# Altium schematic symbol library IC_Maxim.SchLib: 843 symbols (part 19 of 20) (continued)
## MAX15046BAEE+ (continued)
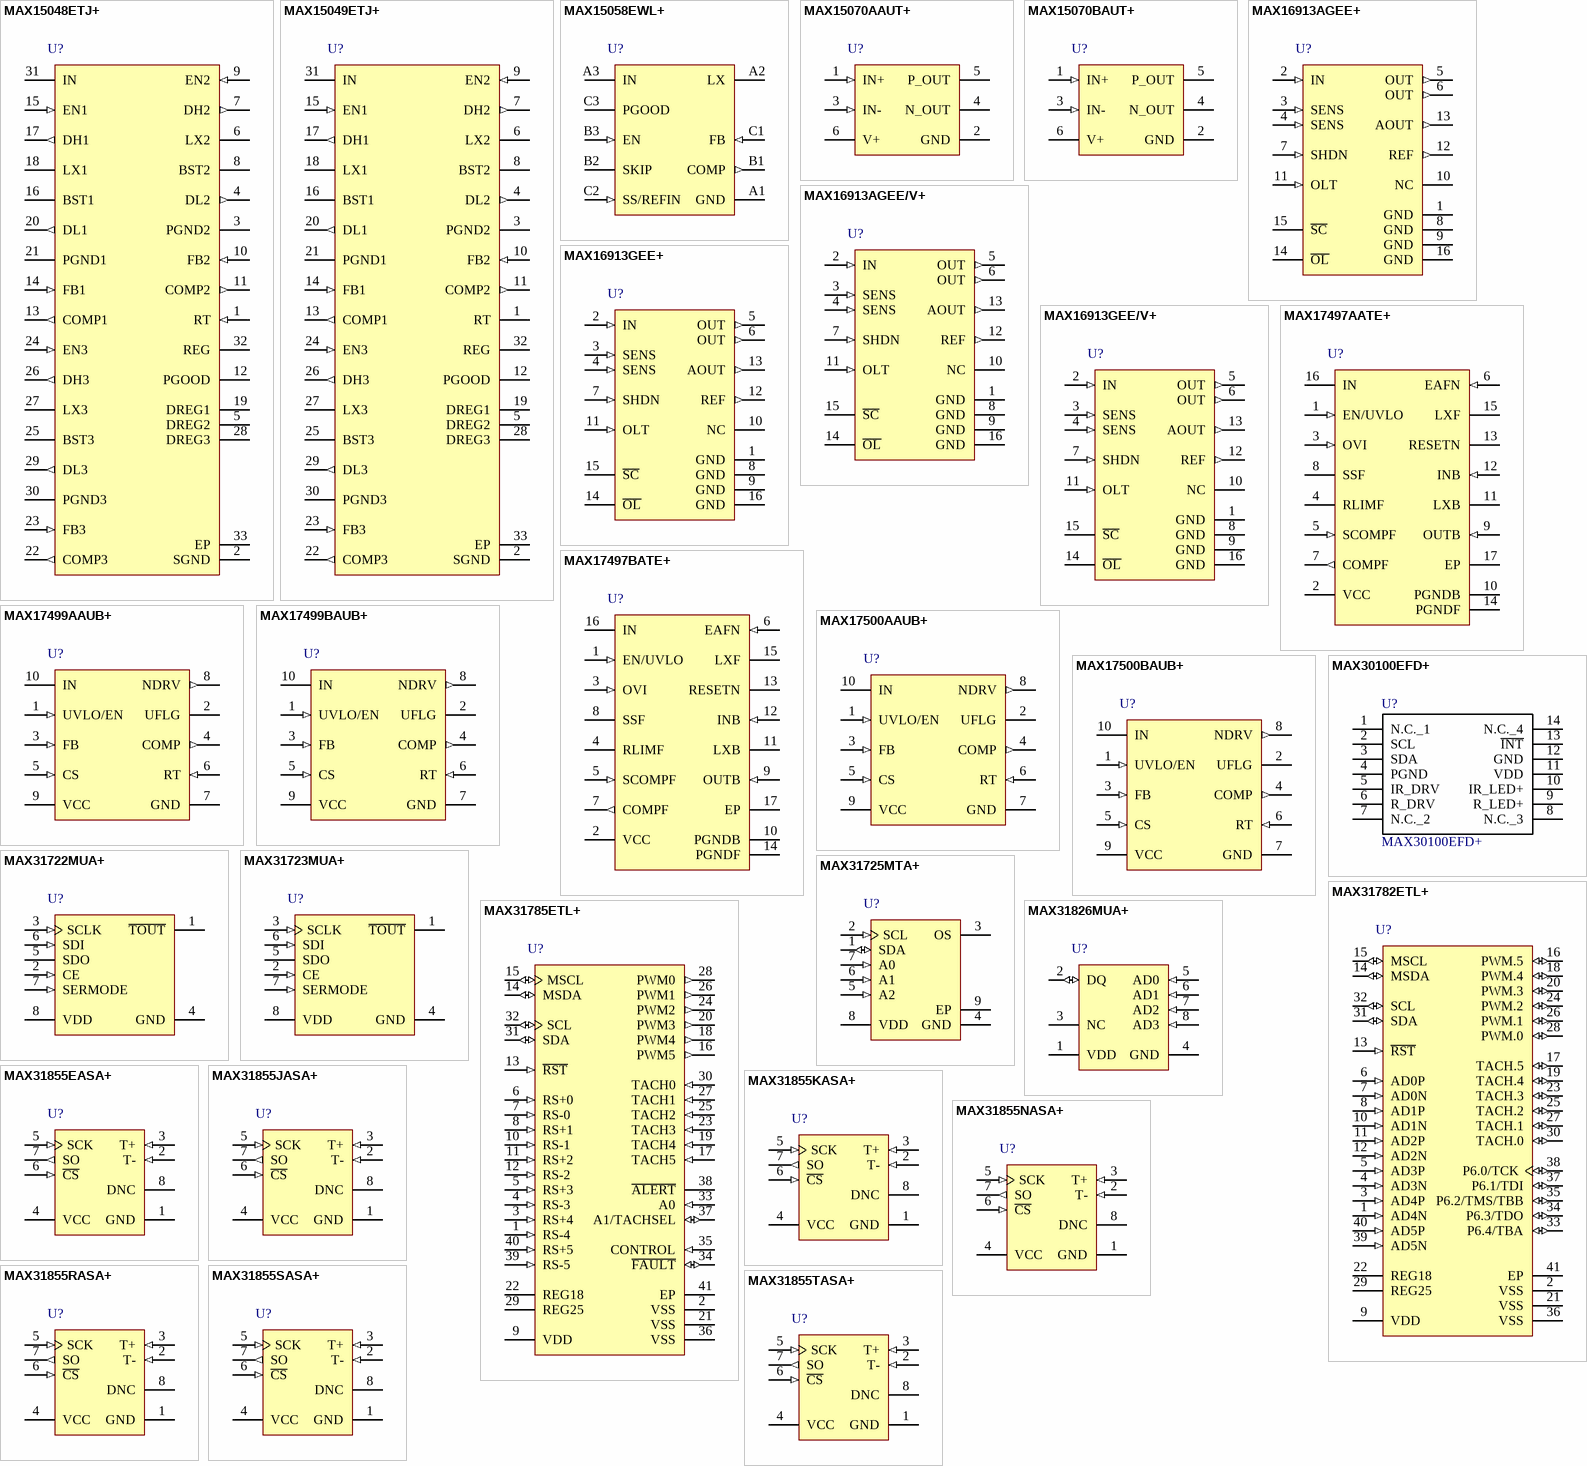
[diagram p23: symbols MAX15048ETJ+ to MAX31855TASA+]

## MAX15048ETJ+
designator U?
Triple-Output Buck Controller with Tracking/Sequencing, 32-Pin TQFN, -40癈 to +85癈, Pb-Free; DatasheetVersion: Rev 0, Jan-2010; PackageVersion: revO, 2011; PackageReference: T3255+4; PackageDescription: 32-Pin Thin Quad Flatpack, No Leads, 5 x 5 x 0.75 mm Body, 0.5 mm Pitch, TQFN, Pb-Free; Code_JEDEC: MO-220-WHHD-2; ComponentLink1Description: Manufacturer URL; ComponentLink1URL: http://www.maxim-ic.com; ComponentLink2Description: Datasheet; ComponentLink2URL: http://datasheets.maxim-ic.com/en/ds/MAX15048-MAX15049.pdf; ComponentLink3Description: Package Specification; ComponentLink3URL: http://pdfserv.maxim-ic.com/package_dwgs/21-0140.PDF
footprint QFN32_0.5-PAD(5X5) (Footprint not found)
pins: 1 RT (in), 2 SGND (power), 3 PGND2 (power), 4 DL2 (out), 5 DREG2 (power), 6 LX2, 7 DH2 (out), 8 BST2 (power), 9 EN2 (in), 10 FB2 (in), 11 COMP2 (out), 12 PGOOD (oc), 13 COMP1 (out), 14 FB1 (in), 15 EN1 (in), 16 BST1 (power), 17 DH1 (out), 18 LX1, 19 DREG1 (power), 20 DL1 (out), 21 PGND1 (power), 22 COMP3 (out), 23 FB3 (in), 24 EN3 (in), 25 BST3 (power), 26 DH3 (out), 27 LX3, 28 DREG3 (power), 29 DL3 (out), 30 PGND3 (power), 31 IN (power), 32 REG (power), 33 EP (power)

## MAX15049ETJ+
designator U?
Triple-Output Buck Controller with Tracking/Sequencing, 32-Pin TQFN, -40癈 to +85癈, Pb-Free; DatasheetVersion: Rev 0, Jan-2010; PackageVersion: revO, 2011; PackageReference: T3255+4; PackageDescription: 32-Pin Thin Quad Flatpack, No Leads, 5 x 5 x 0.75 mm Body, 0.5 mm Pitch, TQFN, Pb-Free; Code_JEDEC: MO-220-WHHD-2; ComponentLink1Description: Manufacturer URL; ComponentLink1URL: http://www.maxim-ic.com; ComponentLink2Description: Datasheet; ComponentLink2URL: http://datasheets.maxim-ic.com/en/ds/MAX15048-MAX15049.pdf; ComponentLink3Description: Package Specification; ComponentLink3URL: http://pdfserv.maxim-ic.com/package_dwgs/21-0140.PDF
footprint QFN32_0.5-PAD(5X5) (Footprint not found)
pins: 1 RT, 2 SGND (power), 3 PGND2 (power), 4 DL2 (out), 5 DREG2 (power), 6 LX2, 7 DH2 (out), 8 BST2 (power), 9 EN2 (in), 10 FB2 (in), 11 COMP2 (out), 12 PGOOD (oc), 13 COMP1 (out), 14 FB1 (in), 15 EN1 (in), 16 BST1 (power), 17 DH1 (out), 18 LX1, 19 DREG1 (power), 20 DL1 (out), 21 PGND1 (power), 22 COMP3 (out), 23 FB3 (in), 24 EN3 (in), 25 BST3 (power), 26 DH3 (out), 27 LX3, 28 DREG3 (power), 29 DL3 (out), 30 PGND3 (power), 31 IN (power), 32 REG (power), 33 EP (power)

## MAX15058EWL+
designator U?
High-Efficiency, 3A, Current-Mode Synchronous, Step-Down Switching Regulator, 9-Pin WLP, -40癈 to +85癈, Pb-Free; DatasheetVersion: Rev 2, Jul-2011; PackageVersion: revA, 2010; PackageReference: W91E1Z+1; PackageDescription: 9-Bump WLP 0.5 mm Pitch, Pb-Free; ComponentLink1Description: Manufacturer URL; ComponentLink1URL: http://www.maxim-ic.com; ComponentLink2Description: Datasheet; ComponentLink2URL: http://datasheets.maxim-ic.com/en/ds/MAX15058.pdf; ComponentLink3Description: Package Specification; ComponentLink3URL: http://pdfserv.maxim-ic.com/package_dwgs/21-0508.PDF
footprint BGA9_0.5(1.6X1.6) (Footprint not found)
pins: A1 GND (power), A2 LX, A3 IN (power), B1 COMP (out), B2 SKIP, B3 EN (in), C1 FB (in), C2 SS/REFIN (in), C3 PGOOD (oc)

## MAX15070AAUT+
designator U?
7A Sink, 3A Source, 12ns, SOT23 MOSFET Driver, 6-Pin SOT, -40癈 to +125癈, Pb-Free; DatasheetVersion: Rev 1, Nov-2011; PackageVersion: revL, 2011; PackageReference: U6+1; PackageDescription: 6-Pin SOT-23 Package, 0.65 mm Pitch, 2.2 mm Lead Span, Pb-Free; Code_JEDEC: MO-178-AB; ComponentLink1Description: Manufacturer URL; ComponentLink1URL: http://www.maxim-ic.com; ComponentLink2Description: Datasheet; ComponentLink2URL: http://datasheets.maxim-ic.com/en/ds/MAX15070A-MAX15070B.pdf; ComponentLink3Description: Package Specification; ComponentLink3URL: http://pdfserv.maxim-ic.com/package_dwgs/21-0058.PDF
footprint SOT23-6 (Footprint not found)
pins: 1 IN+ (in), 2 GND (power), 3 IN- (in), 4 N_OUT (oc), 5 P_OUT (oe), 6 V+ (power)

## MAX15070BAUT+
designator U?
7A Sink, 3A Source, 12ns, SOT23 MOSFET Driver, 6-Pin SOT, -40癈 to +125癈, Pb-Free; DatasheetVersion: Rev 1, Nov-2011; PackageVersion: revL, 2011; PackageReference: U6+1; PackageDescription: 6-Pin SOT-23 Package, 0.65 mm Pitch, 2.2 mm Lead Span, Pb-Free; Code_JEDEC: MO-178-AB; ComponentLink1Description: Manufacturer URL; ComponentLink1URL: http://www.maxim-ic.com; ComponentLink2Description: Datasheet; ComponentLink2URL: http://datasheets.maxim-ic.com/en/ds/MAX15070A-MAX15070B.pdf; ComponentLink3Description: Package Specification; ComponentLink3URL: http://pdfserv.maxim-ic.com/package_dwgs/21-0058.PDF
footprint SOT23-6 (Footprint not found)
pins: 1 IN+ (in), 2 GND (power), 3 IN- (in), 4 N_OUT (oc), 5 P_OUT (oe), 6 V+ (power)

## MAX16913AGEE+
designator U?
Remote Antenna Current-Sense Amplifier and Switch, 13 V / V Gain, -40 to 105 degC, 16-Pin SOP (E16+8F), Pb-Free; PartNumber: MAX16913AGEE+; Bi-Dir. Curr. Sense: No; Gain: 13 V/V; Industry Qualified: Automotive - AECQ100, Automotive - General; DatasheetVersion: Rev. 0; PackageVersion: Rev. K, 04/2012; PackageReference: E16+8F; PackageDescription: 16-Pin Quarter Small-Outline Package, Body 3.9 x 4.89 mm, Pitch 0.635 mm; Supplier Part Number 1: MAX16913AGEE+-ND; Supplier Part Number 2: N/A; Mounting Technology: Surface Mount; Code_JEDEC: MO-137; ComponentLink1Description: Manufacturer URL; ComponentLink1URL: http://www.maximintegrated.com/; ComponentLink2Description: Datasheet; ComponentLink2URL: http://datasheets.maximintegrated.com/en/ds/MAX16913-MAX16913A.pdf; ComponentLink3Description: Package Specification; ComponentLink3URL: http://pdfserv.maximintegrated.com/package_dwgs/21-0055.PDF
footprint SSOP16_0.635 (Footprint not found)
pins: 1 GND (power) "Ground", 2 IN (in) "Input Voltage. Bypass IN to GND with a low-ESR ceramic capacitor with a minimum value of 0.1uF.", 3 SENS (in) "Input to Current-Sense Amplifier. Connect the sense resistor between SENS and IN.", 4 SENS (in) "Input to Current-Sense Amplifier. Connect the sense resistor between SENS and IN.", 5 OUT (out) "Switch Output", 6 OUT (out) "Switch Output", 7 SHDN (in) "Active-High Control Input. Drive SHDN low to turn on the device.", 8 GND (power) "Ground", 9 GND (power) "Ground", 10 NC "No Connection. Not internally connected.", 11 OLT (in) "Open-Load Threshold Setting Input. A resistive divider between REF, OLT, and GND sets the open-load current threshold (MAX16913A). For the MAX16913, connect OLT to GND.", 12 REF (out) "+3V Nominal Reference Output. Use a resistive divider between REF, OLT, and ground to set the open-load current threshold (MAX16913A). The output impedance of this voltage regulator is 5k ohm.", 13 AOUT (out) "Current-Monitor Voltage Output. AOUT can be used to measure the load current by means of an external ADC. The output impedance is 5k ohm.", 14 ~{OL} (oc) "Open-Drain Open-Load Indicator Output. O\L\ goes low when the load current is lower than the open-load current threshold, or when there is a short-to-battery fault. Connect O\L\ to a 10k ohm pullup resistor. See Table 1.", 15 ~{SC} (oc) "Open-Drain Short-Circuit Indicator Output. S\C\ goes low when the load current is greater than the short-circuit current threshold or when there is a short-to-battery fault. Connect S\C\ to a 10k ohm pullup resistor. See (See Datasheet)", 16 GND (power) "Ground"

## MAX16913AGEE/V+
designator U?
Remote Antenna Current-Sense Amplifier and Switch, 13 V / V Gain, -40 to 105 degC, 16-Pin SOP (E16+8F), Pb-Free; PartNumber: MAX16913AGEE/V+; Bi-Dir. Curr. Sense: No; Gain: 13 V/V; Industry Qualified: Automotive - AECQ100, Automotive - General; DatasheetVersion: Rev. 0; PackageVersion: Rev. K, 04/2012; PackageReference: E16+8F; PackageDescription: 16-Pin Quarter Small-Outline Package, Body 3.9 x 4.89 mm, Pitch 0.635 mm; Supplier Part Number 1: MAX16913AGEE/V+-ND; Supplier Part Number 2: 1813102; Supplier Part Number 3: 700-MAX16913AGEEV; Mounting Technology: Surface Mount; Code_JEDEC: MO-137; ComponentLink1Description: Manufacturer URL; ComponentLink1URL: http://www.maximintegrated.com/; ComponentLink2Description: Datasheet; ComponentLink2URL: http://datasheets.maximintegrated.com/en/ds/MAX16913-MAX16913A.pdf; ComponentLink3Description: Package Specification; ComponentLink3URL: http://pdfserv.maximintegrated.com/package_dwgs/21-0055.PDF
footprint SSOP16_0.635 (Footprint not found)
pins: 1 GND (power) "Ground", 2 IN (in) "Input Voltage. Bypass IN to GND with a low-ESR ceramic capacitor with a minimum value of 0.1uF.", 3 SENS (in) "Input to Current-Sense Amplifier. Connect the sense resistor between SENS and IN.", 4 SENS (in) "Input to Current-Sense Amplifier. Connect the sense resistor between SENS and IN.", 5 OUT (out) "Switch Output", 6 OUT (out) "Switch Output", 7 SHDN (in) "Active-High Control Input. Drive SHDN low to turn on the device.", 8 GND (power) "Ground", 9 GND (power) "Ground", 10 NC "No Connection. Not internally connected.", 11 OLT (in) "Open-Load Threshold Setting Input. A resistive divider between REF, OLT, and GND sets the open-load current threshold (MAX16913A). For the MAX16913, connect OLT to GND.", 12 REF (out) "+3V Nominal Reference Output. Use a resistive divider between REF, OLT, and ground to set the open-load current threshold (MAX16913A). The output impedance of this voltage regulator is 5k ohm.", 13 AOUT (out) "Current-Monitor Voltage Output. AOUT can be used to measure the load current by means of an external ADC. The output impedance is 5k ohm.", 14 ~{OL} (oc) "Open-Drain Open-Load Indicator Output. O\L\ goes low when the load current is lower than the open-load current threshold, or when there is a short-to-battery fault. Connect O\L\ to a 10k ohm pullup resistor. See Table 1.", 15 ~{SC} (oc) "Open-Drain Short-Circuit Indicator Output. S\C\ goes low when the load current is greater than the short-circuit current threshold or when there is a short-to-battery fault. Connect S\C\ to a 10k ohm pullup resistor. See (See Datasheet)", 16 GND (power) "Ground"

## MAX16913GEE+
designator U?
Remote Antenna Current-Sense Amplifier and Switch, 13 V / V Gain, -40 to 105 degC, 16-Pin SOP (E16+8F), Pb-Free; PartNumber: MAX16913GEE+; Bi-Dir. Curr. Sense: No; Gain: 13 V/V; Industry Qualified: Automotive - AECQ100, Automotive - General; DatasheetVersion: Rev. 0; PackageVersion: Rev. K, 04/2012; PackageReference: E16+8F; PackageDescription: 16-Pin Quarter Small-Outline Package, Body 3.9 x 4.89 mm, Pitch 0.635 mm; Supplier Part Number 1: MAX16913GEE+-ND; Supplier Part Number 2: N/A; Mounting Technology: Surface Mount; Code_JEDEC: MO-137; ComponentLink1Description: Manufacturer URL; ComponentLink1URL: http://www.maximintegrated.com/; ComponentLink2Description: Datasheet; ComponentLink2URL: http://datasheets.maximintegrated.com/en/ds/MAX16913-MAX16913A.pdf; ComponentLink3Description: Package Specification; ComponentLink3URL: http://pdfserv.maximintegrated.com/package_dwgs/21-0055.PDF
footprint SSOP16_0.635 (Footprint not found)
pins: 1 GND (power) "Ground", 2 IN (in) "Input Voltage. Bypass IN to GND with a low-ESR ceramic capacitor with a minimum value of 0.1uF.", 3 SENS (in) "Input to Current-Sense Amplifier. Connect the sense resistor between SENS and IN.", 4 SENS (in) "Input to Current-Sense Amplifier. Connect the sense resistor between SENS and IN.", 5 OUT (out) "Switch Output", 6 OUT (out) "Switch Output", 7 SHDN (in) "Active-High Control Input. Drive SHDN low to turn on the device.", 8 GND (power) "Ground", 9 GND (power) "Ground", 10 NC "No Connection. Not internally connected.", 11 OLT (in) "Open-Load Threshold Setting Input. A resistive divider between REF, OLT, and GND sets the open-load current threshold (MAX16913A). For the MAX16913, connect OLT to GND.", 12 REF (out) "+3V Nominal Reference Output. Use a resistive divider between REF, OLT, and ground to set the open-load current threshold (MAX16913A). The output impedance of this voltage regulator is 5k ohm.", 13 AOUT (out) "Current-Monitor Voltage Output. AOUT can be used to measure the load current by means of an external ADC. The output impedance is 5k ohm.", 14 ~{OL} (oc) "Open-Drain Open-Load Indicator Output. O\L\ goes low when the load current is lower than the open-load current threshold, or when there is a short-to-battery fault. Connect O\L\ to a 10k ohm pullup resistor. See Table 1.", 15 ~{SC} (oc) "Open-Drain Short-Circuit Indicator Output. S\C\ goes low when the load current is greater than the short-circuit current threshold or when there is a short-to-battery fault. Connect S\C\ to a 10k ohm pullup resistor. See (See Datasheet)", 16 GND (power) "Ground"

## MAX16913GEE/V+
designator U?
Remote Antenna Current-Sense Amplifier and Switch, 13 V / V Gain, -40 to 105 degC, 16-Pin SOP (E16+8F), Pb-Free; PartNumber: MAX16913GEE/V+; Bi-Dir. Curr. Sense: No; Gain: 13 V/V; Industry Qualified: Automotive - AECQ100, Automotive - General; DatasheetVersion: Rev. 0; PackageVersion: Rev. K, 04/2012; PackageReference: E16+8F; PackageDescription: 16-Pin Quarter Small-Outline Package, Body 3.9 x 4.89 mm, Pitch 0.635 mm; Supplier Part Number 1: MAX16913GEE/V+-ND; Supplier Part Number 2: 1813103; Supplier Part Number 3: 700-MAX16913GEEV; Mounting Technology: Surface Mount; Code_JEDEC: MO-137; ComponentLink1Description: Manufacturer URL; ComponentLink1URL: http://www.maximintegrated.com/; ComponentLink2Description: Datasheet; ComponentLink2URL: http://datasheets.maximintegrated.com/en/ds/MAX16913-MAX16913A.pdf; ComponentLink3Description: Package Specification; ComponentLink3URL: http://pdfserv.maximintegrated.com/package_dwgs/21-0055.PDF
footprint SSOP16_0.635 (Footprint not found)
pins: 1 GND (power) "Ground", 2 IN (in) "Input Voltage. Bypass IN to GND with a low-ESR ceramic capacitor with a minimum value of 0.1uF.", 3 SENS (in) "Input to Current-Sense Amplifier. Connect the sense resistor between SENS and IN.", 4 SENS (in) "Input to Current-Sense Amplifier. Connect the sense resistor between SENS and IN.", 5 OUT (out) "Switch Output", 6 OUT (out) "Switch Output", 7 SHDN (in) "Active-High Control Input. Drive SHDN low to turn on the device.", 8 GND (power) "Ground", 9 GND (power) "Ground", 10 NC "No Connection. Not internally connected.", 11 OLT (in) "Open-Load Threshold Setting Input. A resistive divider between REF, OLT, and GND sets the open-load current threshold (MAX16913A). For the MAX16913, connect OLT to GND.", 12 REF (out) "+3V Nominal Reference Output. Use a resistive divider between REF, OLT, and ground to set the open-load current threshold (MAX16913A). The output impedance of this voltage regulator is 5k ohm.", 13 AOUT (out) "Current-Monitor Voltage Output. AOUT can be used to measure the load current by means of an external ADC. The output impedance is 5k ohm.", 14 ~{OL} (oc) "Open-Drain Open-Load Indicator Output. O\L\ goes low when the load current is lower than the open-load current threshold, or when there is a short-to-battery fault. Connect O\L\ to a 10k ohm pullup resistor. See Table 1.", 15 ~{SC} (oc) "Open-Drain Short-Circuit Indicator Output. S\C\ goes low when the load current is greater than the short-circuit current threshold or when there is a short-to-battery fault. Connect S\C\ to a 10k ohm pullup resistor. See (See Datasheet)", 16 GND (power) "Ground"

## MAX17497AATE+
designator U?
AC-DC and DC-DC Peak-Current-Mode Converter with Integrated Step-Down Regulator, 250kHz switching frequency, 16-Pin TQFN, -40癈 to +125癈, Pb-Free; DatasheetVersion: Rev 1, Jan-2012; PackageVersion: revJ, 2010; PackageReference: T1633+5; PackageDescription: 16-Pin Thin Quad Flatpack, No Leads, 3 x 3 x 0.75 mm Body, 0.5 mm Pitch, TQFN, Pb-Free; Code_JEDEC: MO-220WEED-2; ComponentLink1Description: Manufacturer URL; ComponentLink1URL: http://www.maxim-ic.com; ComponentLink2Description: Datasheet; ComponentLink2URL: http://datasheets.maxim-ic.com/en/ds/MAX17497A-MAX17497B.pdf; ComponentLink3Description: Package Specification; ComponentLink3URL: http://pdfserv.maxim-ic.com/package_dwgs/21-0136.PDF
footprint QFN16_0.5-PAD(3X3) (Footprint not found)
pins: 1 EN/UVLO (in), 2 VCC (power), 3 OVI (in), 4 RLIMF, 5 SCOMPF (in), 6 EAFN (in), 7 COMPF (out), 8 SSF, 9 OUTB (in), 10 PGNDB (power), 11 LXB, 12 INB (in), 13 RESETN (oc), 14 PGNDF (power), 15 LXF, 16 IN (power), 17 EP (power)

## MAX17497BATE+
designator U?
AC-DC and DC-DC Peak-Current-Mode Converter with Integrated Step-Down Regulato, 500kHz switching frequencyr, 16-Pin TQFN, -40癈 to +125癈, Pb-Free; DatasheetVersion: Rev 1, Jan-2012; PackageVersion: revJ, 2010; PackageReference: T1633+5; PackageDescription: 16-Pin Thin Quad Flatpack, No Leads, 3 x 3 x 0.75 mm Body, 0.5 mm Pitch, TQFN, Pb-Free; Code_JEDEC: MO-220WEED-2; ComponentLink1Description: Manufacturer URL; ComponentLink1URL: http://www.maxim-ic.com; ComponentLink2Description: Datasheet; ComponentLink2URL: http://datasheets.maxim-ic.com/en/ds/MAX17497A-MAX17497B.pdf; ComponentLink3Description: Package Specification; ComponentLink3URL: http://pdfserv.maxim-ic.com/package_dwgs/21-0136.PDF
footprint QFN16_0.5-PAD(3X3) (Footprint not found)
pins: 1 EN/UVLO (in), 2 VCC (power), 3 OVI (in), 4 RLIMF, 5 SCOMPF (in), 6 EAFN (in), 7 COMPF (out), 8 SSF, 9 OUTB (in), 10 PGNDB (power), 11 LXB, 12 INB (in), 13 RESETN (oc), 14 PGNDF (power), 15 LXF, 16 IN (power), 17 EP (power)

## MAX17499AAUB+
designator U?
Current-Mode PWM Controller with Programmable Switching Frequency, 50% DMAX, 9.5V startup, 10-Pin uMAX, -40癈 to +125癈, Pb-Free; DatasheetVersion: Rev 1, Jul-2011; PackageVersion: revL, 2008; PackageReference: U10+2; PackageDescription: 10-Pin Micro-MAX Thin Shrink Small Outline (uSOP), 3 x 3 x 0.85 mm Body, 0.5 mm Pitch, Pb-Free; Code_JEDEC: MO-187-BA; ComponentLink1Description: Manufacturer URL; ComponentLink1URL: http://www.maxim-ic.com; ComponentLink2Description: Datasheet; ComponentLink2URL: http://datasheets.maxim-ic.com/en/ds/MAX17499-MAX17500.pdf; ComponentLink3Description: Package Specification; ComponentLink3URL: http://pdfserv.maxim-ic.com/package_dwgs/21-0061.PDF
footprint VSSOP10_0.5 (Footprint not found)
pins: 1 UVLO/EN (in), 2 UFLG (oc), 3 FB (in), 4 COMP (out), 5 CS (in), 6 RT (in), 7 GND (power), 8 NDRV (out), 9 VCC (power), 10 IN (power)

## MAX17499BAUB+
designator U?
Current-Mode PWM Controller with Programmable Switching Frequency, 75% DMAX, 9.5V startup, 10-Pin uMAX, -40癈 to +125癈, Pb-Free; DatasheetVersion: Rev 1, Jul-2011; PackageVersion: revL, 2008; PackageReference: U10+2; PackageDescription: 10-Pin Micro-MAX Thin Shrink Small Outline (uSOP), 3 x 3 x 0.85 mm Body, 0.5 mm Pitch, Pb-Free; Code_JEDEC: MO-187-BA; ComponentLink1Description: Manufacturer URL; ComponentLink1URL: http://www.maxim-ic.com; ComponentLink2Description: Datasheet; ComponentLink2URL: http://datasheets.maxim-ic.com/en/ds/MAX17499-MAX17500.pdf; ComponentLink3Description: Package Specification; ComponentLink3URL: http://pdfserv.maxim-ic.com/package_dwgs/21-0061.PDF
footprint VSSOP10_0.5 (Footprint not found)
pins: 1 UVLO/EN (in), 2 UFLG (oc), 3 FB (in), 4 COMP (out), 5 CS (in), 6 RT (in), 7 GND (power), 8 NDRV (out), 9 VCC (power), 10 IN (power)

## MAX17500AAUB+
designator U?
Current-Mode PWM Controller with Programmable Switching Frequency, 50% DMAX, 22V startup, 10-Pin uMAX, -40癈 to +125癈, Pb-Free; DatasheetVersion: Rev 1, Jul-2011; PackageVersion: revL, 2008; PackageReference: U10+2; PackageDescription: 10-Pin Micro-MAX Thin Shrink Small Outline (uSOP), 3 x 3 x 0.85 mm Body, 0.5 mm Pitch, Pb-Free; Code_JEDEC: MO-187-BA; ComponentLink1Description: Manufacturer URL; ComponentLink1URL: http://www.maxim-ic.com; ComponentLink2Description: Datasheet; ComponentLink2URL: http://datasheets.maxim-ic.com/en/ds/MAX17499-MAX17500.pdf; ComponentLink3Description: Package Specification; ComponentLink3URL: http://pdfserv.maxim-ic.com/package_dwgs/21-0061.PDF
footprint VSSOP10_0.5 (Footprint not found)
pins: 1 UVLO/EN (in), 2 UFLG (oc), 3 FB (in), 4 COMP (out), 5 CS (in), 6 RT (in), 7 GND (power), 8 NDRV (out), 9 VCC (power), 10 IN (power)

## MAX17500BAUB+
designator U?
Current-Mode PWM Controller with Programmable Switching Frequency, 75% DMAX, 22V startup, 10-Pin uMAX, -40癈 to +125癈, Pb-Free; DatasheetVersion: Rev 1, Jul-2011; PackageVersion: revL, 2008; PackageReference: U10+2; PackageDescription: 10-Pin Micro-MAX Thin Shrink Small Outline (uSOP), 3 x 3 x 0.85 mm Body, 0.5 mm Pitch, Pb-Free; Code_JEDEC: MO-187-BA; ComponentLink1Description: Manufacturer URL; ComponentLink1URL: http://www.maxim-ic.com; ComponentLink2Description: Datasheet; ComponentLink2URL: http://datasheets.maxim-ic.com/en/ds/MAX17499-MAX17500.pdf; ComponentLink3Description: Package Specification; ComponentLink3URL: http://pdfserv.maxim-ic.com/package_dwgs/21-0061.PDF
footprint VSSOP10_0.5 (Footprint not found)
pins: 1 UVLO/EN (in), 2 UFLG (oc), 3 FB (in), 4 COMP (out), 5 CS (in), 6 RT (in), 7 GND (power), 8 NDRV (out), 9 VCC (power), 10 IN (power)

## MAX30100EFD+
designator U?
Integrated Circuit; Manufacturer_Name: Maxim Integrated; Datasheet Link: https://datasheets.maximintegrated.com/en/ds/MAX30100.pdf; Height: 3mm; Manufacturer_Part_Number: MAX30100EFD+; Mouser Part Number: 700-MAX30100EFD+; Mouser Price/Stock: https://www.mouser.com/Search/Refine.aspx?Keyword=700-MAX30100EFD%2B
footprint DFN14_0.8(3X5.5) (Footprint not found)
pins: 1 N.C._1, 2 SCL, 3 SDA, 4 PGND, 5 IR_DRV, 6 R_DRV, 7 N.C._2, 8 N.C._3, 9 R_LED+, 10 IR_LED+, 11 VDD, 12 GND, 13 ~{INT}, 14 N.C._4

## MAX31722MUA+
designator U?
Digital Thermometers and Thermostats with SPI / 3-Wire Interface, 12 Bits Temperature Resolution, -55 to 125 degC, 8-Pin SOP (U8+1), Pb-Free; Generic Part Number: MAX31722; PartNumber: MAX31722MUA+; Alarm Output: Overt; Functions: Memory, Single Temperature Alarm ,Standalone Thermostat; Interface: 3-Wire/SPI, 3-Wire; Parasite Pwr.: No; DatasheetVersion: Rev. 0; PackageVersion: Rev. L, 08/2009; PackageReference: U8+1; PackageDescription: 8-Pin Micro-MAX, Thin Shrink Small-Outline (U8+1), Body 3 x 3 mm, Pitch 0.65 mm; Supplier Part Number 1: MAX31722MUA+-ND; Supplier Part Number 2: 2212248; Supplier Part Number 3: 45W6313; Supplier Part Number 4: 700-MAX31722MUA+; Mounting Technology: Surface Mount; Code_JEDEC: MO-187; ComponentLink1Description: Manufacturer URL; ComponentLink1URL: http://www.maximintegrated.com/; ComponentLink2Description: Datasheet; ComponentLink2URL: http://datasheets.maximintegrated.com/en/ds/MAX31722-MAX31723.pdf; ComponentLink3Description: Package Specification; ComponentLink3URL: http://pdfserv.maximintegrated.com/package_dwgs/21-0036.PDF
footprint VSSOP8_0.65 (Footprint not found)
pins: 1 ~{TOUT} (oc) "Thermostat Output. Open-drain output indicator for internal thermal alarm limits.", 2 CE (in) "Chip Enable. Must be asserted high for communication to take place for either the SPI or 3-wire interfaces.", 3 SCLK (in) "Serial-Clock Input. Used to synchronize data movement on the serial interface for either SPI or 3-wire interfaces.", 4 GND (power) "Ground. Ground connection.", 5 SDO (hiz) "Serial-Data Output. When SPI communication is selected, the SDO pin is the serial-data output for the SPI bus. When 3-wire communication is selected, this pin must be connected to the SDI pin. The SDI and SDO pins function (See Datasheet)", 6 SDI (in) "Serial-Data Input. When SPI communication is selected, the SDI pin is the serial-data input for the SPI bus. When 3-wire communication is selected, this pin must be connected to the SDO pin. The SDI and SDO pins function as (See Datasheet)", 7 SERMODE (in) "Serial-Interface Mode Input. This pin selects which interface is used. When connected to VDD, SPI communication is selected. When connected to GND, 3-wire communication is selected.", 8 VDD (power) "Supply Voltage. Power-supply input."

## MAX31723MUA+
designator U?
Digital Thermometers and Thermostats with SPI / 3-Wire Interface, 12 Bits Temperature Resolution, -55 to 125 degC, 8-Pin SOP (U8+1), Pb-Free; Generic Part Number: MAX31723; PartNumber: MAX31723MUA+; Alarm Output: Overt; Functions: Memory, Single Temperature Alarm ,Standalone Thermostat; Interface: 3-Wire/SPI, 3-Wire; Parasite Pwr.: No; DatasheetVersion: Rev. 0; PackageVersion: Rev. L, 08/2009; PackageReference: U8+1; PackageDescription: 8-Pin Micro-MAX, Thin Shrink Small-Outline (U8+1), Body 3 x 3 mm, Pitch 0.65 mm; Supplier Part Number 1: MAX31723MUA+-ND; Supplier Part Number 2: 2212251; Supplier Part Number 3: 45W6314; Supplier Part Number 4: 700-MAX31723MUA+; Mounting Technology: Surface Mount; Code_JEDEC: MO-187; ComponentLink1Description: Manufacturer URL; ComponentLink1URL: http://www.maximintegrated.com/; ComponentLink2Description: Datasheet; ComponentLink2URL: http://datasheets.maximintegrated.com/en/ds/MAX31722-MAX31723.pdf; ComponentLink3Description: Package Specification; ComponentLink3URL: http://pdfserv.maximintegrated.com/package_dwgs/21-0036.PDF
footprint VSSOP8_0.65 (Footprint not found)
pins: 1 ~{TOUT} (oc) "Thermostat Output. Open-drain output indicator for internal thermal alarm limits.", 2 CE (in) "Chip Enable. Must be asserted high for communication to take place for either the SPI or 3-wire interfaces.", 3 SCLK (in) "Serial-Clock Input. Used to synchronize data movement on the serial interface for either SPI or 3-wire interfaces.", 4 GND (power) "Ground. Ground connection.", 5 SDO (hiz) "Serial-Data Output. When SPI communication is selected, the SDO pin is the serial-data output for the SPI bus. When 3-wire communication is selected, this pin must be connected to the SDI pin. The SDI and SDO pins function (See Datasheet)", 6 SDI (in) "Serial-Data Input. When SPI communication is selected, the SDI pin is the serial-data input for the SPI bus. When 3-wire communication is selected, this pin must be connected to the SDO pin. The SDI and SDO pins function as (See Datasheet)", 7 SERMODE (in) "Serial-Interface Mode Input. This pin selects which interface is used. When connected to VDD, SPI communication is selected. When connected to GND, 3-wire communication is selected.", 8 VDD (power) "Supply Voltage. Power-supply input."

## MAX31725MTA+
designator U?
+ / -0.5 degC Local I2C Temperature Sensor, 16 Bits Temperature Resolution, -55 to 150 degC, 8-Pin SON (T833+2), Pb-Free; Generic Part Number: MAX31725; PartNumber: MAX31725MTA+; Alarm Output: Overt; Interface: 2-Wire/I2C/SMBus; Multi Droppable: Yes; Parasite Pwr.: No; DatasheetVersion: Rev. 0; PackageVersion: Rev. J, 08/2009; PackageReference: T833+2; PackageDescription: 8-Pin Plastic Very Very Thin Dual Flatpack No Leads, Exposed Pad (T833+2); Supplier Part Number 1: MAX31725MTA+-ND; Supplier Part Number 2: 700-MAX31725MTA+; Mounting Technology: Surface Mount; Code_JEDEC: MO229; ComponentLink1Description: Manufacturer URL; ComponentLink1URL: http://www.maximintegrated.com/; ComponentLink2Description: Datasheet; ComponentLink2URL: http://datasheets.maximintegrated.com/en/ds/MAX31725.pdf; ComponentLink3Description: Package Specification; ComponentLink3URL: http://pdfserv.maximintegrated.com/package_dwgs/21-0137.PDF
footprint DFN8_0.65-PAD(3X3) (Footprint not found)
pins: 1 SDA (io) "Serial-Data Input/Output Line. Open drain. Connect SDA to a pullup resistor. High impedance for supply voltages from 0 to 3.7V.", 2 SCL (in) "Serial-Data Clock Input. Open drain. Connect SCL to a pullup resistor. High impedance for supply voltages from 0 to 3.7V.", 3 OS (oc) "Overtemperature Shutdown Output. Open drain. Connect OS to a pullup resistor.", 4 GND (power) "Ground", 5 A2 (in) "I2C Slave Address Input. Connect A2 to GND or VDD to set the desired I2C bus address. Do not leave unconnected (Table 1).", 6 A1 (in) "I2C Slave Address Input. Connect A1 to GND, VDD, SDA, or SCL to set the desired I2C bus address. Do not leave unconnected (Table 1). High impedance for supply voltages from 0 to 3.7V.", 7 A0 (in) "I2C Slave Address Input. Connect A0 to GND, VDD, SDA, or SCL to set the desired I2C bus address. Do not leave unconnected (Table 1). High impedance for supply voltages from 0 to 3.7V.", 8 VDD (power) "Positive Supply Voltage Input. Bypass to GND with a 0.1uF bypass capacitor.", 9 EP (power) "Exposed Pad (Bottom Side of Package). Connect EP to GND."

## MAX31782ETL+
designator U?
System Management Microcontroller, -40 to 85 degC, 40-Pin QFN (T4066+2), Pb-Free; Generic Part Number: MAX31782; PartNumber: MAX31782ETL+; Fan Cntrl.: PWM; Fan Controller Functions: Fan Failure Detector, Remote & Local Sensor; Interface: 2-Wire/I2C/SMBus, JTAG; DatasheetVersion: Rev. 2; PackageVersion: Rev. M, 03/2012; PackageReference: T4066+2; PackageDescription: 40-Pin Thin Quad Flatpack, No Leads, Body 6 x 6 mm, Pitch 0.5 mm; Supplier Part Number 1: MAX31782ETL+-ND; Supplier Part Number 2: 700-MAX31782ETL+; Mounting Technology: Surface Mount; Code_JEDEC: MO-220; ComponentLink1Description: Manufacturer URL; ComponentLink1URL: http://www.maximintegrated.com/; ComponentLink2Description: Datasheet; ComponentLink2URL: http://datasheets.maximintegrated.com/en/ds/MAX31782.pdf; ComponentLink3Description: Package Specification; ComponentLink3URL: http://pdfserv.maximintegrated.com/package_dwgs/21-0141.PDF
footprint QFN40_0.5-PAD(6X6) (Footprint not found)
pins: 1 AD4N (in) "Ground Reference for ADC.4 Voltage Measurement", 2 VSS (power) "Supply Return Node", 3 AD4P (in) "ADC Voltage-Sense Input, Measurement Relative to AD4N", 4 AD3N (in) "Ground Reference for ADC.3 Voltage Measurement. Connected to external reference pin when enabled.", 5 AD3P (in) "ADC Voltage-Sense Input, Measurement Relative to AD3N", 6 AD0P (in) "ADC Voltage-Sense Input, Measurement Relative to AD0N", 7 AD0N (in) "Ground Reference for ADC.0 Voltage Measurement", 8 AD1P (in) "ADC Voltage-Sense Input, Measurement Relative to AD1N", 9 VDD (power) "Input Supply. +2.7V to +5.5V input range. Bypass VDD to VSS with a 0.1uF capacitor.", 10 AD1N (in) "Ground Reference for ADC.1 Voltage Measurement", 11 AD2P (in) "ADC Voltage-Sense Input, Measurement Relative to AD2N", 12 AD2N (in) "Ground Reference for ADC.2 Voltage Measurement", 13 ~{RST} (in) "Active-Low Reset. A low-level voltage at this pin resets the IC.", 14 MSDA (io) "Master I2C-Compatible Bidirectional Data Line. When disabled, this pin can be used as GPIO P2.7.", 15 MSCL (io) "Master I2C-Compatible Clock. When disabled, this pin can be used as GPIO P2.6.", 16 PWM.5 (io) "PWM Output No. 5. When disabled, this pin can be used as GPIO.", 17 TACH.5 (io) "Tachometer Input No. 5. When disabled, this pin can be used as GPIO.", 18 PWM.4 (io) "PWM Output No. 4. When disabled, this pin can be used as GPIO.", 19 TACH.4 (io) "Tachometer Input No. 4. When disabled, this pin can be used as GPIO.", 20 PWM.3 (io) "PWM Output No. 3. When disabled, this pin can be used as GPIO.", 21 VSS (power) "Supply Return Node", 22 REG18 "Bypass REG18 to VSS with 1uF and high-frequency 10nF capacitors. Do not use for external circuitry.", 23 TACH.3 (io) "Tachometer Input No. 3. When disabled, this pin can be used as GPIO.", 24 PWM.2 (io) "PWM Output No. 2. When disabled, this pin can be used as GPIO.", 25 TACH.2 (io) "Tachometer Input No. 2. When disabled, this pin can be used as GPIO.", 26 PWM.1 (io) "PWM Output No. 1. When disabled, this pin can be used as GPIO.", 27 TACH.1 (io) "Tachometer Input No. 1. When disabled, this pin can be used as GPIO.", 28 PWM.0 (io) "PWM Output No. 0. When disabled, this pin can be used as GPIO.", 29 REG25 "Bypass REG25 to VSS with 1FF and high-frequency 10nF capacitors. Do not use for external circuitry.", 30 TACH.0 (io) "Tachometer Input No. 0. When disabled, this pin can be used as GPIO.", 31 SDA (io) "Slave I2C-Compatible Bidirectional Data Line. When disabled, this pin can be used as GPIO.", 32 SCL (io) "Slave I2C-Compatible Clock. When disabled, this pin can be used as GPIO.", 33 P6.4/TBA (io) "Programmable I/O Pin. Alternate function: Timer/Counter TBA", 34 P6.3/TDO (io) "Programmable I/O Pin. Alternate function: JTAG TDO", 35 P6.2/TMS/TBB (io) "Programmable I/O Pin. Alternate functions: Timer/Counter TBB, JTAG TMS", 36 VSS (power) "Supply Return Node", 37 P6.1/TDI (io) "Programmable I/O Pin. Alternate function: JTAG TDI", 38 P6.0/TCK (io) "Programmable I/O Pin. Alternate function: JTAG TCK", 39 AD5N (in) "Ground Reference for ADC.5 Voltage Measurement", 40 AD5P (in) "ADC Voltage-Sense Input, Measurement Relative to AD5N", 41 EP (power) "Exposed Pad. Not electrically connected to IC. Connect to VSS."

## MAX31785ETL+
designator U?
6-Channel Intelligent Fan Controller, -40 to 85 degC, 40-Pin QFN (T4066+2), Pb-Free; Generic Part Number: MAX31785; PartNumber: MAX31785ETL+; Fan Cntrl.: PWM; Fan Controller Functions: Dual Temperature Alarms, Fan Failure Detector ,Remote & Local Sensor ,Temperature Switch/Temperature Comparator; Interface: 2-Wire/I2C/SMBus; DatasheetVersion: Rev. 3; PackageVersion: Rev. M, 03/2012; PackageReference: T4066+2; PackageDescription: 40-Pin Thin Quad Flatpack, No Leads, Body 6 x 6 mm, Pitch 0.5 mm; Supplier Part Number 1: MAX31785ETL+-ND; Supplier Part Number 2: 700-MAX31785ETL+; Mounting Technology: Surface Mount; Code_JEDEC: MO-220; ComponentLink1Description: Manufacturer URL; ComponentLink1URL: http://www.maximintegrated.com/; ComponentLink2Description: Datasheet; ComponentLink2URL: http://datasheets.maximintegrated.com/en/ds/MAX31785.pdf; ComponentLink3Description: Package Specification; ComponentLink3URL: http://pdfserv.maximintegrated.com/package_dwgs/21-0141.PDF
footprint QFN40_0.5-PAD(6X6) (Footprint not found)
pins: 1 RS-4 (in) "Ground Reference for Thermal Diode or Remote Voltage ADC4 Measurement", 2 VSS (power) "Digital-Supply Return Node (Ground)", 3 RS+4 (in) "Thermal Diode or Remote Voltage ADC Input, Measurement Relative to RS-4", 4 RS-3 (in) "Ground Reference for Thermal Diode or Remote Voltage ADC3 Measurement", 5 RS+3 (in) "Thermal Diode or Remote Voltage ADC Input, Measurement Relative to RS-3", 6 RS+0 (in) "Thermal Diode or Remote Voltage ADC Input, Measurement Relative to RS-0", 7 RS-0 (in) "Ground Reference for Thermal Diode or Remote Voltage ADC0 Measurement", 8 RS+1 (in) "Thermal Diode or Remote Voltage ADC Input, Measurement Relative to RS-1", 9 VDD (power) "Supply Voltage. Bypass VDD to VSS with a 0.1uF capacitor.", 10 RS-1 (in) "Ground Reference for Thermal Diode or Remote Voltage ADC1 Measurement", 11 RS+2 (in) "Thermal Diode or Remote Voltage ADC Input, Measurement Relative to RS-2", 12 RS-2 (in) "Ground Reference for Thermal Diode or Remote Voltage ADC2 Measurement", 13 ~{RST} (in) "Reset Active-Low Input", 14 MSDA (io) "Master I2C Data Input/Output. Open-drain output.", 15 MSCL (io) "Master I2C Clock Input/Output. Open-drain output.", 16 PWM5 (out) "Fan PWM Output #5. CMOS push-pull output. Low when the fan is disabled. A 100% duty cycle implies this pin is continuously high.", 17 TACH5 (in) "Fan Tachometer Input", 18 PWM4 (out) "Fan PWM Output #4. CMOS push-pull output. Low when the fan is disabled. A 100% duty cycle implies this pin is continuously high.", 19 TACH4 (in) "Fan Tachometer Input", 20 PWM3 (out) "Fan PWM Output #3. CMOS push-pull output. Low when the fan is disabled. A 100% duty cycle implies this pin is continuously high.", 21 VSS (power) "Digital-Supply Return Node (Ground)", 22 REG18 "Regulator for Low-Voltage Digital Circuitry. Bypass REG18 to VSS with 1uF and 10nF capacitors. Do not connect other circuitry to this pin.", 23 TACH3 (in) "Fan Tachometer Input", 24 PWM2 (out) "Fan PWM Output #2. CMOS push-pull output. Low when the fan is disabled. A 100% duty cycle implies this pin is continuously high.", 25 TACH2 (in) "Fan Tachometer Input", 26 PWM1 (out) "Fan PWM Output #1. CMOS push-pull output. Low when the fan is disabled. A 100% duty cycle implies this pin is continuously high.", 27 TACH1 (in) "Fan Tachometer Input", 28 PWM0 (out) "Fan PWM Output #0. CMOS push-pull output. Low when the fan is disabled. A 100% duty cycle implies this pin is continuously high.", 29 REG25 "Regulator for Analog Circuitry. Bypass REG25 to VSS with 1uF and 10uF capacitors. Do not connect other circuitry to this pin.", 30 TACH0 (in) "Fan Tachometer Input", 31 SDA (io) "I2C/SMBus-Compatible Input/Output", 32 SCL (io) "I2C/SMBus-Compatible Clock Input", 33 A0 (in) "SMBus Address 0 Input. This pin is sampled on device power-up to determine the SMBus address; connect a 100k ohm resistor from this pin to either VSS or VDD to set the address.", 34 ~{FAULT} (io) "Active-Low, Open-Drain Fault Input/Output. If enabled with the MFR_FAULT_RESPONSE command, this pin is asserted during a fault condition (fan speed, overtemperature, overvoltage, or undervoltage). Also, if enabled with the (See Datasheet)", 35 CONTROL (in) "Global Fan-Off Control. When this pin is connected low, all fans are forced off (other functionality remains active). When this pin is connected high (or left open circuit), fans operate normally. This pin has a 50us (See Datasheet)", 36 VSS (power) "Digital-Supply Return Node (Ground)", 37 A1/TACHSEL (io) "SMBus Address 1 Input/Dual Tach-Select Output. This dual-function pin is sampled on device power-up to determine the SMBus address; connect a 100k ohm resistor from this pin to either VSS or VDD to set the address. After (See Datasheet)", 38 ~{ALERT} (oc) "Active-Low, Open-Drain Alert Output", 39 RS-5 (in) "Ground Reference for Thermal Diode or Remote Voltage ADC5 Measurement", 40 RS+5 (in) "Thermal Diode or Remote Voltage ADC Input, Measurement Relative to RS-5", 41 EP (power) "Exposed Pad (Bottom Side of Package). Connect EP to VSS."

## MAX31826MUA+
designator U?
1-Wire Digital Temperature Sensor with 1 Kbit Lockable EEPROM, -55 to 125 degC, 8-Pin SOP (U8+1), Pb-Free; Generic Part Number: MAX31826; PartNumber: MAX31826MUA+; Functions: Memory; Multi Droppable: Yes; Sensor Type: Local; DatasheetVersion: Rev. 0; PackageVersion: Rev. L, 08/2009; PackageReference: U8+1; PackageDescription: 8-Pin Micro-MAX, Thin Shrink Small-Outline (U8+1), Body 3 x 3 mm, Pitch 0.65 mm; Supplier Part Number 1: MAX31826MUA+-ND; Supplier Part Number 2: 700-MAX31826MUA+; Interface: 1-Wire; Parasite Pwr.: Yes; RoHS: Pb-Free; Mounting Technology: Surface Mount; Code_JEDEC: MO-187; ComponentLink1Description: Manufacturer URL; ComponentLink1URL: http://www.maximintegrated.com/; ComponentLink2Description: Datasheet; ComponentLink2URL: http://datasheets.maximintegrated.com/en/ds/MAX31826.pdf; ComponentLink3Description: Package Specification; ComponentLink3URL: http://pdfserv.maximintegrated.com/package_dwgs/21-0036.PDF
footprint VSSOP8_0.65 (Footprint not found)
pins: 1 VDD (power) "Optional VDD. VDD must be grounded for operation in parasite-power mode.", 2 DQ (io) "Data Input/Output. Open-drain 1-Wire interface pin. Also provides power to the device when used in parasite-power mode (see the Parasite Power section.)", 3 NC "No Connection. Not internally connected.", 4 GND (power) "Ground", 5 AD0 (in) "Location Address Input (Least Significant Bit)", 6 AD1 (in) "Location Address Input", 7 AD2 (in) "Location Address Input", 8 AD3 (in) "Location Address Input (Most Significant Bit)"

## MAX31855EASA+
designator U?
Cold Junction Compensated Thermocouple to Digital Converter, 14 Bits Temperature Resolution, -40 to 125 degC, 8-Pin SOIC (S8+4), Pb-Free; Generic Part Number: MAX31855; PartNumber: MAX31855EASA+; Functions: Thermocouple-to-Digital Converter; Interface: SPI; Parasite Pwr.: No; DatasheetVersion: Rev. 2; PackageVersion: Rev. D, 10/2012; PackageReference: S8+4; PackageDescription: 8-Pin Small-Outline IC, Narrow, Body 3.9 x 4.9 mm, Pitch 1.27 mm; Supplier Part Number 1: MAX31855EASA+-ND; Supplier Part Number 2: 700-MAX31855EASA+; Mounting Technology: Surface Mount; Code_JEDEC: MS-012; ComponentLink1Description: Manufacturer URL; ComponentLink1URL: http://www.maximintegrated.com/; ComponentLink2Description: Datasheet; ComponentLink2URL: http://datasheets.maximintegrated.com/en/ds/MAX31855.pdf; ComponentLink3Description: Package Specification; ComponentLink3URL: http://pdfserv.maximintegrated.com/package_dwgs/21-0041.PDF
footprint SOIC8_1.27 (Footprint not found)
pins: 1 GND (power) "Ground", 2 T- (in) "Thermocouple Input. See Table 1. Do not connect to GND.", 3 T+ (in) "Thermocouple Input. See Table 1.", 4 VCC (power) "Power-Supply Voltage", 5 SCK (in) "Serial-Clock Input", 6 ~{CS} (in) "Active-Low Chip Select. Set C\S\ low to enable the serial interface.", 7 SO (out) "Serial-Data Output", 8 DNC "Do Not Connect"

## MAX31855JASA+
designator U?
Cold Junction Compensated Thermocouple to Digital Converter, 14 Bits Temperature Resolution, -40 to 125 degC, 8-Pin SOIC (S8+4), Pb-Free; Generic Part Number: MAX31855; PartNumber: MAX31855JASA+; Functions: Thermocouple-to-Digital Converter; Interface: SPI; Parasite Pwr.: No; DatasheetVersion: Rev. 2; PackageVersion: Rev. D, 10/2012; PackageReference: S8+4; PackageDescription: 8-Pin Small-Outline IC, Narrow, Body 3.9 x 4.9 mm, Pitch 1.27 mm; Supplier Part Number 1: MAX31855JASA+-ND; Supplier Part Number 2: 700-MAX31855JASA+; Mounting Technology: Surface Mount; Code_JEDEC: MS-012; ComponentLink1Description: Manufacturer URL; ComponentLink1URL: http://www.maximintegrated.com/; ComponentLink2Description: Datasheet; ComponentLink2URL: http://datasheets.maximintegrated.com/en/ds/MAX31855.pdf; ComponentLink3Description: Package Specification; ComponentLink3URL: http://pdfserv.maximintegrated.com/package_dwgs/21-0041.PDF
footprint SOIC8_1.27 (Footprint not found)
pins: 1 GND (power) "Ground", 2 T- (in) "Thermocouple Input. See Table 1. Do not connect to GND.", 3 T+ (in) "Thermocouple Input. See Table 1.", 4 VCC (power) "Power-Supply Voltage", 5 SCK (in) "Serial-Clock Input", 6 ~{CS} (in) "Active-Low Chip Select. Set C\S\ low to enable the serial interface.", 7 SO (out) "Serial-Data Output", 8 DNC "Do Not Connect"

## MAX31855KASA+
designator U?
Cold Junction Compensated Thermocouple to Digital Converter, 14 Bits Temperature Resolution, -40 to 125 degC, 8-Pin SOIC (S8+4), Pb-Free; Generic Part Number: MAX31855; PartNumber: MAX31855KASA+; Functions: Thermocouple-to-Digital Converter; Interface: SPI; Parasite Pwr.: No; DatasheetVersion: Rev. 2; PackageVersion: Rev. D, 10/2012; PackageReference: S8+4; PackageDescription: 8-Pin Small-Outline IC, Narrow, Body 3.9 x 4.9 mm, Pitch 1.27 mm; Supplier Part Number 1: MAX31855KASA+-ND; Supplier Part Number 2: 700-MAX31855KASA+; Mounting Technology: Surface Mount; Code_JEDEC: MS-012; ComponentLink1Description: Manufacturer URL; ComponentLink1URL: http://www.maximintegrated.com/; ComponentLink2Description: Datasheet; ComponentLink2URL: http://datasheets.maximintegrated.com/en/ds/MAX31855.pdf; ComponentLink3Description: Package Specification; ComponentLink3URL: http://pdfserv.maximintegrated.com/package_dwgs/21-0041.PDF
footprint SOIC8_1.27 (Footprint not found)
pins: 1 GND (power) "Ground", 2 T- (in) "Thermocouple Input. See Table 1. Do not connect to GND.", 3 T+ (in) "Thermocouple Input. See Table 1.", 4 VCC (power) "Power-Supply Voltage", 5 SCK (in) "Serial-Clock Input", 6 ~{CS} (in) "Active-Low Chip Select. Set C\S\ low to enable the serial interface.", 7 SO (out) "Serial-Data Output", 8 DNC "Do Not Connect"